# Altium footprint library CONN_HDR_1.27MM_ST_SMD.PcbLib: 118 footprints (part 8 of 8)
Each footprint in its own frame and in the unit in brackets; x right, y up, seen from the top. Pads: shape width x height; smd on the part's side, far side on the other; paste and mask are expansions set on the pad; w line width, h text height; cw(c..) or ccw(c..) is an arc to the next point about the centre after c.
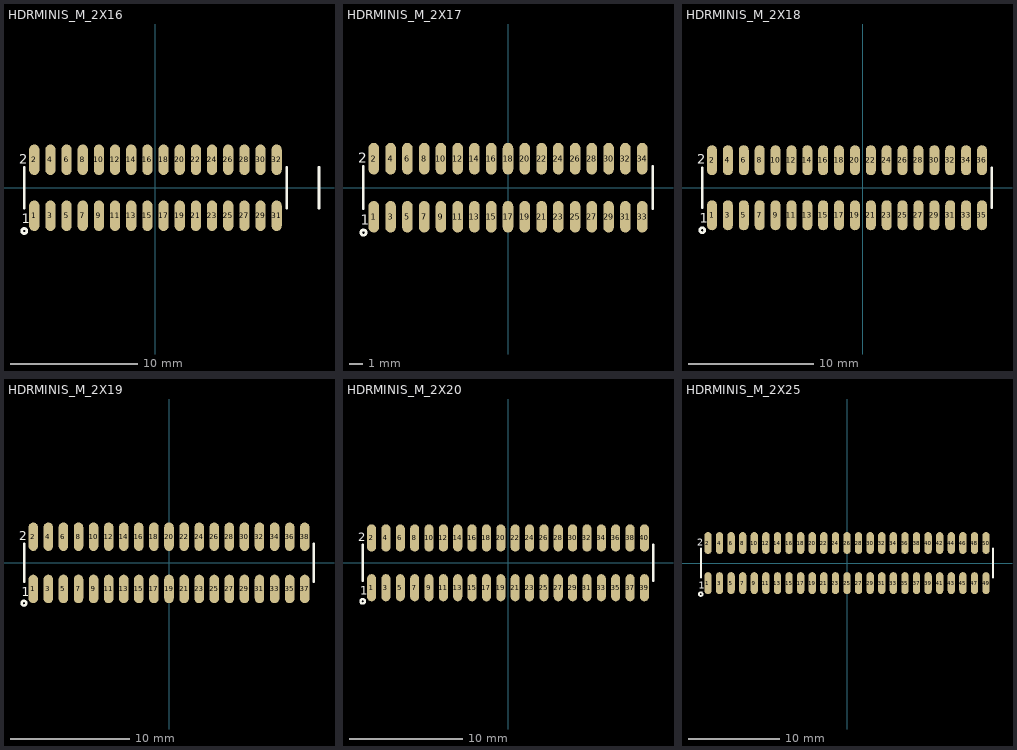
[diagram p7: the footprints below, top view; thin cyan lines are the x and y axes]

## HDRMINIS_M_2X16 [mm] "FCI Minitek127® BTB, HEADER UNSHROUDED, SMT"
pads (32):
  oval 0.8x2.4 smd mask+0.1: 1(-9.525,-2.2) 2(-9.525,2.2) 3(-8.255,-2.2) 4(-8.255,2.2) 5(-6.985,-2.2) 6(-6.985,2.2) 7(-5.715,-2.2) 8(-5.715,2.2) 9(-4.445,-2.2) 10(-4.445,2.2) 11(-3.175,-2.2) 12(-3.175,2.2) 13(-1.905,-2.2) 14(-1.905,2.2) 15(-0.635,-2.2) 16(-0.635,2.2) 17(0.635,-2.2) 18(0.635,2.2) 19(1.905,-2.2) 20(1.905,2.2) 21(3.175,-2.2) 22(3.175,2.2) 23(4.445,-2.2) 24(4.445,2.2) 25(5.715,-2.2) 26(5.715,2.2) 27(6.985,-2.2) 28(6.985,2.2) 29(8.255,-2.2) 30(8.255,2.2) 31(9.525,-2.2) 32(9.525,2.2)
Top Overlay:
  circle w0.2: c-10.31,-3.4 r0.2
  lines w0.2: 10.3,-1.6 10.3,1.6 ; 12.85,-1.6 12.85,1.6 ; -10.3,-1.6 -10.3,1.6 -10.3,-1.6
  text "1" at -10.51,-2.8 h0.75
  text "2" at -10.71,1.9 h0.75
3D body "2002112100020d4lf.stp": height 4.5, standoff 0, extent -10.16,-2.8 2.54,2.7
3D body "20021121-00004XXLFc.stp": height 4.5, standoff 0, extent 2.54,-2.75 5.08,2.75
3D body "20021121-00004XXLFc.stp": height 4.5, standoff 0, extent 5.08,-2.75 7.62,2.75
3D body "20021121-00004XXLFc.stp": height 4.5, standoff 0, extent 7.62,-2.75 10.16,2.75

## HDRMINIS_M_2X17 [mm] "FCI Minitek127® BTB, HEADER UNSHROUDED, SMT"
pads (34):
  oval 0.8x2.4 smd mask+0.1: 1(-10.16,-2.2) 2(-10.16,2.2) 3(-8.89,-2.2) 4(-8.89,2.2) 5(-7.62,-2.2) 6(-7.62,2.2) 7(-6.35,-2.2) 8(-6.35,2.2) 9(-5.08,-2.2) 10(-5.08,2.2) 11(-3.81,-2.2) 12(-3.81,2.2) 13(-2.54,-2.2) 14(-2.54,2.2) 15(-1.27,-2.2) 16(-1.27,2.2) 17(0,-2.2) 18(0,2.2) 19(1.27,-2.2) 20(1.27,2.2) 21(2.54,-2.2) 22(2.54,2.2) 23(3.81,-2.2) 24(3.81,2.2) 25(5.08,-2.2) 26(5.08,2.2) 27(6.35,-2.2) 28(6.35,2.2) 29(7.62,-2.2) 30(7.62,2.2) 31(8.89,-2.2) 32(8.89,2.2) 33(10.16,-2.2) 34(10.16,2.2)
Top Overlay:
  circle w0.2: c-10.945,-3.4 r0.2
  lines w0.2: -10.95,-1.6 -10.95,1.6 ; 10.95,-1.6 10.95,1.6
  text "2" at -11.345,1.9 h0.75
  text "1" at -11.145,-2.8 h0.75
3D body "20021121-00004XXLFc.stp": height 4.5, standoff 0, extent 8.255,-2.75 10.795,2.75
3D body "20021121-00004XXLFc.stp": height 4.5, standoff 0, extent 6.985,-2.75 9.525,2.75
3D body "20021121-00004XXLFc.stp": height 4.5, standoff 0, extent 4.445,-2.75 6.985,2.75
3D body "20021121-00004XXLFc.stp": height 4.5, standoff 0, extent 1.905,-2.75 4.445,2.75
3D body "2002112100020d4lf.stp": height 4.5, standoff 0, extent -10.795,-2.8 1.905,2.7

## HDRMINIS_M_2X18 [mm] "FCI Minitek127® BTB, HEADER UNSHROUDED, SMT"
pads (36):
  oval 0.8x2.4 smd mask+0.1: 1(-12.065,-2.2) 2(-12.065,2.2) 3(-10.795,-2.2) 4(-10.795,2.2) 5(-9.525,-2.2) 6(-9.525,2.2) 7(-8.255,-2.2) 8(-8.255,2.2) 9(-6.985,-2.2) 10(-6.985,2.2) 11(-5.715,-2.2) 12(-5.715,2.2) 13(-4.445,-2.2) 14(-4.445,2.2) 15(-3.175,-2.2) 16(-3.175,2.2) 17(-1.905,-2.2) 18(-1.905,2.2) 19(-0.635,-2.2) 20(-0.635,2.2) 21(0.635,-2.2) 22(0.635,2.2) 23(1.905,-2.2) 24(1.905,2.2) 25(3.175,-2.2) 26(3.175,2.2) 27(4.445,-2.2) 28(4.445,2.2) 29(5.715,-2.2) 30(5.715,2.2) 31(6.985,-2.2) 32(6.985,2.2) 33(8.255,-2.2) 34(8.255,2.2) 35(9.525,-2.2) 36(9.525,2.2)
Top Overlay:
  circle w0.2: c-12.85,-3.4 r0.2
  lines w0.2: -12.85,-1.6 -12.85,1.6 ; 10.31,-1.6 10.31,1.6
  text "1" at -13.05,-2.8 h0.75
  text "2" at -13.25,1.9 h0.75
3D body "2002112100020d4lf.stp": height 4.5, standoff 0, extent -12.7,-2.8 0,2.7
3D body "20021121-00004XXLFc.stp": height 4.5, standoff 0, extent 0,-2.75 2.54,2.75
3D body "20021121-00004XXLFc.stp": height 4.5, standoff 0, extent 2.54,-2.75 5.08,2.75
3D body "20021121-00004XXLFc.stp": height 4.5, standoff 0, extent 5.08,-2.75 7.62,2.75
3D body "20021121-00004XXLFc.stp": height 4.5, standoff 0, extent 7.62,-2.75 10.16,2.75

## HDRMINIS_M_2X19 [mm] "FCI Minitek127® BTB, HEADER UNSHROUDED, SMT"
pads (38):
  oval 0.8x2.4 smd mask+0.1: 1(-11.43,-2.2) 2(-11.43,2.2) 3(-10.16,-2.2) 4(-10.16,2.2) 5(-8.89,-2.2) 6(-8.89,2.2) 7(-7.62,-2.2) 8(-7.62,2.2) 9(-6.35,-2.2) 10(-6.35,2.2) 11(-5.08,-2.2) 12(-5.08,2.2) 13(-3.81,-2.2) 14(-3.81,2.2) 15(-2.54,-2.2) 16(-2.54,2.2) 17(-1.27,-2.2) 18(-1.27,2.2) 19(0,-2.2) 20(0,2.2) 21(1.27,-2.2) 22(1.27,2.2) 23(2.54,-2.2) 24(2.54,2.2) 25(3.81,-2.2) 26(3.81,2.2) 27(5.08,-2.2) 28(5.08,2.2) 29(6.35,-2.2) 30(6.35,2.2) 31(7.62,-2.2) 32(7.62,2.2) 33(8.89,-2.2) 34(8.89,2.2) 35(10.16,-2.2) 36(10.16,2.2) 37(11.43,-2.2) 38(11.43,2.2)
Top Overlay:
  circle w0.2: c-12.215,-3.4 r0.2
  lines w0.2: -12.2,-1.6 -12.2,1.6 ; 12.2,-1.6 12.2,1.6
  text "2" at -12.615,1.9 h0.75
  text "1" at -12.415,-2.8 h0.75
3D body "2002112100020d4lf.stp": height 4.5, standoff 0, extent -12.065,-2.8 0.635,2.7
3D body "20021121-00004XXLFc.stp": height 4.5, standoff 0, extent 3.175,-2.8 5.715,2.7
3D body "20021121-00004XXLFc.stp": height 4.5, standoff 0, extent 0.635,-2.8 3.175,2.7
3D body "20021121-00004XXLFc.stp": height 4.5, standoff 0, extent 5.715,-2.8 8.255,2.7
3D body "20021121-00006XXLFc.stp": height 4.5, standoff 0, extent 8.255,-2.8 12.065,2.7

## HDRMINIS_M_2X20 [mm] "FCI Minitek127® BTB, HEADER UNSHROUDED, SMT"
pads (40):
  oval 0.8x2.4 smd mask+0.1: 1(-12.065,-2.2) 2(-12.065,2.2) 3(-10.795,-2.2) 4(-10.795,2.2) 5(-9.525,-2.2) 6(-9.525,2.2) 7(-8.255,-2.2) 8(-8.255,2.2) 9(-6.985,-2.2) 10(-6.985,2.2) 11(-5.715,-2.2) 12(-5.715,2.2) 13(-4.445,-2.2) 14(-4.445,2.2) 15(-3.175,-2.2) 16(-3.175,2.2) 17(-1.905,-2.2) 18(-1.905,2.2) 19(-0.635,-2.2) 20(-0.635,2.2) 21(0.635,-2.2) 22(0.635,2.2) 23(1.905,-2.2) 24(1.905,2.2) 25(3.175,-2.2) 26(3.175,2.2) 27(4.445,-2.2) 28(4.445,2.2) 29(5.715,-2.2) 30(5.715,2.2) 31(6.985,-2.2) 32(6.985,2.2) 33(8.255,-2.2) 34(8.255,2.2) 35(9.525,-2.2) 36(9.525,2.2) 37(10.795,-2.2) 38(10.795,2.2) 39(12.065,-2.2) 40(12.065,2.2)
Top Overlay:
  circle w0.2: c-12.85,-3.4 r0.2
  lines w0.2: -12.85,-1.6 -12.85,1.6 ; 12.85,-1.6 12.85,1.6
  text "2" at -13.25,1.9 h0.75
  text "1" at -13.05,-2.8 h0.75
3D body "2002112100020d4lf.stp": height 4.5, standoff 0, extent 0,-2.8 12.7,2.7
3D body "2002112100020d4lf.stp": height 4.5, standoff 0, extent -12.7,-2.8 0,2.7

## HDRMINIS_M_2X25 [mm] "FCI Minitek127® BTB, HEADER UNSHROUDED, SMT"
pads (50):
  oval 0.8x2.4 smd mask+0.1: 1(-15.24,-2.2) 2(-15.24,2.2) 3(-13.97,-2.2) 4(-13.97,2.2) 5(-12.7,-2.2) 6(-12.7,2.2) 7(-11.43,-2.2) 8(-11.43,2.2) 9(-10.16,-2.2) 10(-10.16,2.2) 11(-8.89,-2.2) 12(-8.89,2.2) 13(-7.62,-2.2) 14(-7.62,2.2) 15(-6.35,-2.2) 16(-6.35,2.2) 17(-5.08,-2.2) 18(-5.08,2.2) 19(-3.81,-2.2) 20(-3.81,2.2) 21(-2.54,-2.2) 22(-2.54,2.2) 23(-1.27,-2.2) 24(-1.27,2.2) 25(0,-2.2) 26(0,2.2) 27(1.27,-2.2) 28(1.27,2.2) 29(2.54,-2.2) 30(2.54,2.2) 31(3.81,-2.2) 32(3.81,2.2) 33(5.08,-2.2) 34(5.08,2.2) 35(6.35,-2.2) 36(6.35,2.2) 37(7.62,-2.2) 38(7.62,2.2) 39(8.89,-2.2) 40(8.89,2.2) 41(10.16,-2.2) 42(10.16,2.2) 43(11.43,-2.2) 44(11.43,2.2) 45(12.7,-2.2) 46(12.7,2.2) 47(13.97,-2.2) 48(13.97,2.2) 49(15.24,-2.2) 50(15.24,2.2)
Top Overlay:
  circle w0.2: c-16.025,-3.4 r0.2
  lines w0.2: -16,-1.6 -16,1.6 ; 16,-1.6 16,1.6
  text "1" at -16.225,-2.8 h0.75
  text "2" at -16.425,1.9 h0.75
3D body "20021121-00006XXLFc.stp": height 4.5, standoff 0, extent 12.065,-2.8 15.875,2.7
3D body "20021121-00004XXLFc.stp": height 4.5, standoff 0, extent 9.525,-2.8 12.065,2.7
3D body "2002112100020d4lf.stp": height 4.5, standoff 0, extent -3.175,-2.8 9.525,2.7
3D body "2002112100020d4lf.stp": height 4.5, standoff 0, extent -15.875,-2.8 -3.175,2.7